# Altium footprint library microbuilder.PCBLIB: 422 footprints (part 25 of 27)
Each footprint in its own frame and in the unit in brackets; x right, y up, seen from the top. Pads: shape width x height; smd on the part's side, far side on the other; paste and mask are expansions set on the pad; w line width, h text height; cw(c..) or ccw(c..) is an arc to the next point about the centre after c.
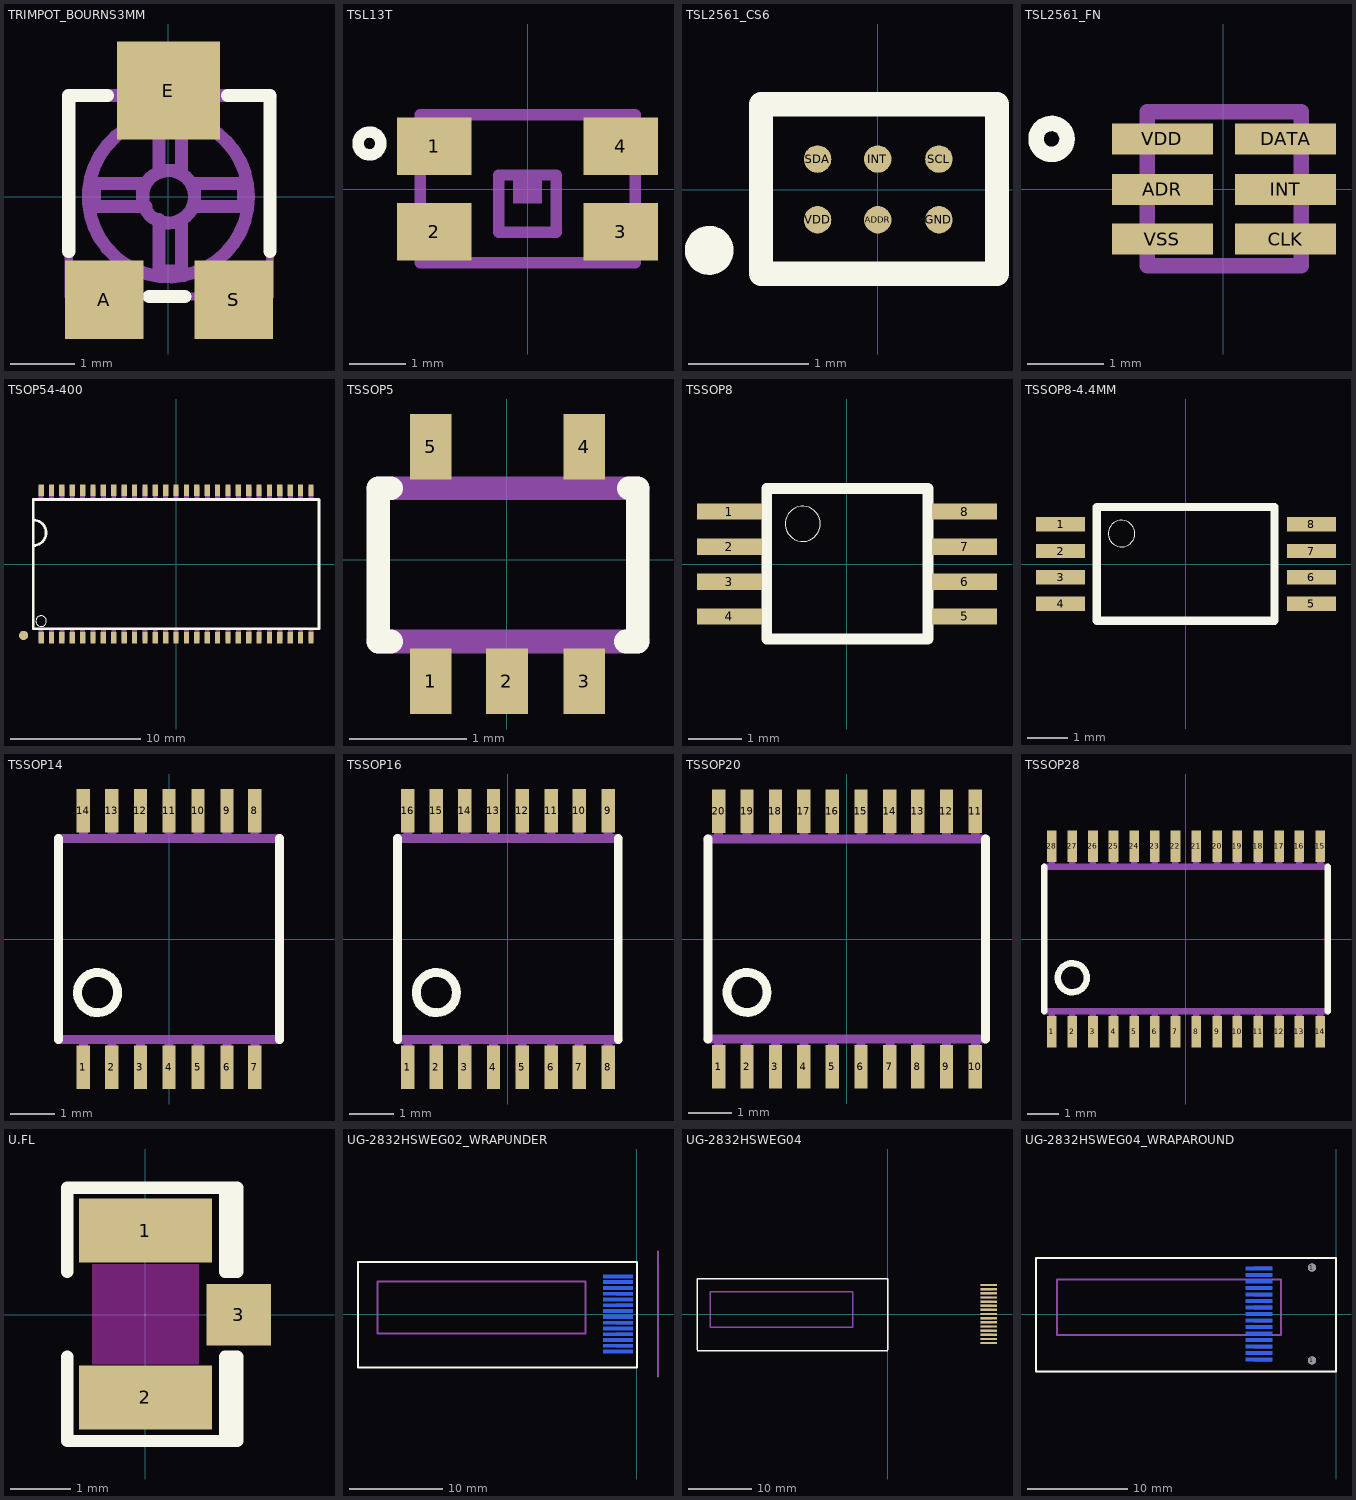
[diagram p24: the footprints below, top view; thin cyan lines are the x and y axes]

## TRIMPOT_BOURNS3MM [mil]
pads (3):
  rect 48x48 smd: A(-39.37,-62.99) S(40,-62.99)
  rect 63x60 smd: E(0,65)
Top Overlay:
  lines w8: -61.02,-33.46 -61.02,62 -37.4,62 ; -11.81,-61.02 10,-61.02 ; 36,62 62,62 62,-33.46
Mechanical 16:
  circle w8: c0,0 r49
  circle w8: c0,0 r16
  lines w5: -61.02,62 -61.02,-61.02 62,-61.02 62,62
  lines w8: -61.02,62 62,62 ; -15.75,-3.94 -15.75,8 -45.28,8 -45.28,-5.91 -13.78,-5.91 ; -5.91,-13.78 -5.91,-45.28 8,-45.28 8,-13.78 ; -5.91,16 -5.91,46 8,46 8,16 -5.91,16 ; 16,-5.91 46,-5.91 46,8 16,8 16,-5.91

## TSL13T [mil]
pads (4):
  rect 52x40 smd: 1(-64.96,30) 2(-64.96,-29.53) 3(65,-29.53) 4(65,30)
Top Overlay:
  circle w8: c-110.24,32 r8
Mechanical 16:
  rectangle: -10,-10 10,10
  lines w8: -74.8,-51.18 75,-51.18 75,52 -74.8,52 -74.8,-51.18 ; -20,-30 20,-30 20,10 -20,10 -20,-30

## TSL2561_CS6 [mil]
pads (6):
  rrect100% 9x9 smd: ADDR(0,-9.84) GND(20,-9.84) INT(0,10) SCL(20,10) SDA(-19.68,10) VDD(-19.68,-9.84)
Top Overlay:
  circle w8: c-55.12,-19.84 r4
  lines w8: -38.19,-27.56 -38.19,28 39,28 39,-27.56 -38.19,-27.56
Mechanical 16:
  lines w5: -38.19,-27.56 39,-27.56 39,28 -38.19,28 -38.19,-27.56
  text "1" at -16.06,-46.06 h18.6
  text "2" at 5,-46.06 h18.6
  text "3" at 27,-46.06 h18.6
  text "6" at -16.06,37 h18.6
  text "5" at 5,37 h18.6
  text "4" at 27,37 h18.6

## TSL2561_FN [mil]
pads (6):
  rect 52x16 smd: ADR(-31.5,0) CLK(32,-25.59) DATA(32,26) INT(32,0) VDD(-31.5,26) VSS(-31.5,-25.59)
Top Overlay:
  circle w8: c-88.58,26 r8
Top Paste:
  rectangle: -56.3,18 -17.91,34
  rectangle: -56.3,-7.68 -17.91,8
  rectangle: -56.3,-33.27 -17.91,-17.91
  rectangle: 18,18 57,34
  rectangle: 18,-7.68 57,8
  rectangle: 18,-33.27 57,-17.91
Mechanical 16:
  lines w8: -39.37,-39.37 40,-39.37 40,40 -39.37,40 -39.37,-39.37

## TSOP54-400 [mil]
pads (55):
  rect 16x36 smd: 1(-409.45,-223.62) 2(-377.95,-223.62) 3(-346.46,-223.62) 4(-314.96,-223.62) 5(-283.46,-223.62) 6(-251.97,-223.62) 7(-220.47,-223.62) 8(-188.98,-223.62) 9(-157.48,-223.62) 10(-125.98,-223.62) 11(-94.49,-223.62) 12(-62.99,-223.62) 13(-31.5,-223.62) 14(0,-223.62) 15(32,-223.62) 16(63,-223.62) 17(95,-223.62) 18(126,-223.62) 19(158,-223.62) 20(189,-223.62) 21(221,-223.62) 22(252,-223.62) 23(284,-223.62) 24(315,-223.62) 25(347,-223.62) 26(378,-223.62) 27(410,-223.62) 28(410,224) 29(378,224) 30(347,224) 31(315,224) 32(284,224) 33(252,224) 34(221,224) 35(189,224) 36(158,224) 37(126,224) 38(95,224) 39(63,224) 40(32,224) 41(0,224) 42(-31.5,224) 43(-62.99,224) 44(-94.49,224) 45(-125.98,224) 46(-157.48,224) 47(-188.98,224) 48(-220.47,224) 49(-251.97,224) 50(-283.46,224) 51(-314.96,224) 52(-346.46,224) 53(-377.95,224) 54(-409.45,224)
  rrect100% 28x28 smd: P$1(-462.6,-216.54)
Top Overlay:
  circle w0: c-409.45,-173.23 r16
  lines w8: -433.4,56 ccw(c-433.4,95) -433.4,134 ; -433.4,56 -433.4,134 ; -433.4,56 -433.4,-196 434,-196 434,196 -433.4,196 -433.4,134
Mechanical 16:
  region: -402.07,-231.5 -402.07,-200 -416.83,-200 -416.83,-231.5
  region: -370.57,-231.5 -370.57,-200 -385.33,-200 -385.33,-231.5
  region: -339.07,-231.5 -339.07,-200 -353.84,-200 -353.84,-231.5
  region: -307.58,-231.5 -307.58,-200 -322.34,-200 -322.34,-231.5
  region: -276.08,-231.5 -276.08,-200 -290.85,-200 -290.85,-231.5
  region: -244.59,-231.5 -244.59,-200 -259.35,-200 -259.35,-231.5
  region: -213.09,-231.5 -213.09,-200 -227.85,-200 -227.85,-231.5
  region: -181.59,-231.5 -181.59,-200 -196.36,-200 -196.36,-231.5
  region: -150.1,-231.5 -150.1,-200 -164.86,-200 -164.86,-231.5
  region: -118.6,-231.5 -118.6,-200 -133.37,-200 -133.37,-231.5
  region: -87.11,-231.5 -87.11,-200 -101.87,-200 -101.87,-231.5
  region: -55.61,-231.5 -55.61,-200 -70.37,-200 -70.37,-231.5
  region: -24.11,-231.5 -24.11,-200 -38.88,-200 -38.88,-231.5
  region: 7.51,-231.62 7.51,-199.87 -7.26,-199.87 -7.26,-231.62
  region: 39.38,-231.75 39.38,-199.75 24.62,-199.75 24.62,-231.75
  region: 70.88,-231.25 70.88,-200.25 56.12,-200.25 56.12,-231.25
  region: 102.38,-231.75 102.38,-199.75 87.62,-199.75 87.62,-231.75
  region: 133.88,-231.25 133.88,-200.25 119.12,-200.25 119.12,-231.25
  region: 165.38,-231.75 165.38,-199.75 150.62,-199.75 150.62,-231.75
  region: 196.88,-231.25 196.88,-200.25 182.12,-200.25 182.12,-231.25
  region: 228.38,-231.75 228.38,-199.75 213.62,-199.75 213.62,-231.75
  region: 259.88,-231.25 259.88,-200.25 245.12,-200.25 245.12,-231.25
  region: 291.38,-231.75 291.38,-199.75 276.62,-199.75 276.62,-231.75
  region: 322.88,-231.25 322.88,-200.25 308.12,-200.25 308.12,-231.25
  region: 354.38,-231.75 354.38,-199.75 339.62,-199.75 339.62,-231.75
  region: 385.88,-231.25 385.88,-200.25 371.12,-200.25 371.12,-231.25
  region: 417.38,-231.75 417.38,-199.75 402.62,-199.75 402.62,-231.75
  region: 402.5,232.5 402.5,200.5 417.5,200.5 417.5,232.5
  region: 386,201 386,232 371,232 371,201
  region: 354.5,200.5 354.5,232.5 339.5,232.5 339.5,200.5
  region: 323,201 323,232 308,232 308,201
  region: 291.5,200.5 291.5,232.5 276.5,232.5 276.5,200.5
  region: 260,201 260,232 245,232 245,201
  region: 228.5,200.5 228.5,232.5 213.5,232.5 213.5,200.5
  region: 197,201 197,232 182,232 182,201
  region: 165.5,200.5 165.5,232.5 150.5,232.5 150.5,200.5
  region: 134,201 134,232 119,232 119,201
  region: 102.5,200.5 102.5,232.5 87.5,232.5 87.5,200.5
  region: 71,201 71,232 56,232 56,201
  region: 39.5,200.5 39.5,232.5 24.5,232.5 24.5,200.5
  region: 7.63,200.63 7.63,232.37 -7.37,232.37 -7.37,200.63
  region: -24,200.75 -24,232.25 -39,232.25 -39,200.75
  region: -55.49,200.75 -55.49,232.25 -70.49,232.25 -70.49,200.75
  region: -86.99,200.75 -86.99,232.25 -101.99,232.25 -101.99,200.75
  region: -118.48,200.75 -118.48,232.25 -133.48,232.25 -133.48,200.75
  region: -149.98,200.75 -149.98,232.25 -164.98,232.25 -164.98,200.75
  region: -181.48,200.75 -181.48,232.25 -196.48,232.25 -196.48,200.75
  region: -212.97,200.75 -212.97,232.25 -227.97,232.25 -227.97,200.75
  region: -244.47,200.75 -244.47,232.25 -259.47,232.25 -259.47,200.75
  region: -275.96,200.75 -275.96,232.25 -290.96,232.25 -290.96,200.75
  region: -307.46,200.75 -307.46,232.25 -322.46,232.25 -322.46,200.75
  region: -338.96,200.75 -338.96,232.25 -353.96,232.25 -353.96,200.75
  region: -370.45,200.75 -370.45,232.25 -385.45,232.25 -385.45,200.75
  region: -401.95,200.75 -401.95,232.25 -416.95,232.25 -416.95,200.75

## TSSOP5 [mil]
pads (5):
  rect 14x22 smd: 1(-25.59,-40.94) 2(0,-40.94) 3(26,-40.94) 4(26,38) 5(-25.59,38)
Top Overlay:
  lines w8: -38.98,-27.56 -43.31,-27.56 -43.31,24 -38.98,24 ; 40,-27.56 44,-27.56 44,24 41,24
Mechanical 16:
  lines w5: -43.31,-27.56 -43.31,24 ; 44,-27.56 44,24
  lines w8: -43.31,-27.56 44,-27.56 ; -43.31,24 44,24

## TSSOP8 [mil]
pads (8):
  rect 48x12 smd: 1(-86.61,39) 2(-86.61,13) 3(-86.61,-12.8) 4(-86.61,-38.39) 5(87,-38.39) 6(87,-12.8) 7(87,13) 8(87,39)
Top Overlay:
  circle w0: c-32.48,30 r13
  lines w8: -59.06,-55.12 60,-55.12 60,56 -59.06,56 -59.06,-55.12
Top Paste:
  rectangle: -109,34 -65,43
  rectangle: -109,8 -65,17
  rectangle: -109,-17 -65,-8
  rectangle: -109,-43 -65,-34
  rectangle: 65,-43 109,-34
  rectangle: 65,-17 109,-8
  rectangle: 65,8 109,17
  rectangle: 65,34 109,43
Mechanical 16:
  rectangle: -102.36,34 -62.99,44
  rectangle: -102.36,8 -62.99,18
  rectangle: -102.36,-17.72 -62.99,-7.87
  rectangle: -102.36,-43.31 -62.99,-33.46
  rectangle: 63,-43.31 103,-33.46
  rectangle: 63,-17.72 103,-7.87
  rectangle: 63,8 103,18
  rectangle: 63,34 103,44

## TSSOP8-4.4MM [mil]
pads (8):
  rect 48x14 smd: 1(-122.05,39) 2(-122.05,13) 3(-122.05,-12.8) 4(-122.05,-38.39) 5(123,-38.39) 6(123,-12.8) 7(123,13) 8(123,39)
Top Overlay:
  circle w0: c-62.48,30 r13
  lines w8: -86.61,-55.12 87,-55.12 87,56 -86.61,56 -86.61,-55.12
Mechanical 16:
  rectangle: -137.8,34 -98.43,44
  rectangle: -137.8,8 -98.43,18
  rectangle: -137.8,-17.72 -98.43,-7.87
  rectangle: -137.8,-43.31 -98.43,-33.46
  rectangle: 99,-43.31 138,-33.46
  rectangle: 99,-17.72 138,-7.87
  rectangle: 99,8 138,18
  rectangle: 99,34 138,44

## TSSOP14 [mil]
pads (14):
  rect 12x39 smd: 1(-76.77,-114.87) 2(-51.18,-114.87) 3(-25.59,-114.87) 4(0,-114.87) 5(26,-114.87) 6(52,-114.87) 7(77,-114.87) 8(77,115) 9(52,115) 10(26,115) 11(0,115) 12(-25.59,115) 13(-51.18,115) 14(-76.77,115)
Top Overlay:
  circle w8: c-64,-48 r18
  lines w8: -99,-89.87 -99,90 ; 99,-89.87 99,90
Mechanical 16:
  rectangle: -80.77,-122.87 -72.77,-89.87
  rectangle: -55.18,-122.87 -47.18,-89.87
  rectangle: -29.59,-122.87 -21.59,-89.87
  rectangle: -4,-122.87 4,-89.87
  rectangle: 22,-122.87 30,-89.87
  rectangle: 48,-122.87 56,-89.87
  rectangle: 73,-122.87 81,-89.87
  rectangle: 73,90 81,123
  rectangle: 48,90 56,123
  rectangle: 22,90 30,123
  rectangle: -4,90 4,123
  rectangle: -29.59,90 -21.59,123
  rectangle: -55.18,90 -47.18,123
  rectangle: -80.77,90 -72.77,123
  lines w8: -99,-89.87 99,-89.87 ; -99,90 99,90

## TSSOP16 [mil]
pads (16):
  rect 12x39 smd: 1(-89.57,-114.87) 2(-63.98,-114.87) 3(-38.39,-114.87) 4(-12.8,-114.87) 5(13,-114.87) 6(39,-114.87) 7(64,-114.87) 8(90,-114.87) 9(90,115) 10(64,115) 11(39,115) 12(13,115) 13(-12.8,115) 14(-38.39,115) 15(-63.98,115) 16(-89.57,115)
Top Overlay:
  circle w8: c-64,-48 r18
  lines w8: -99,-89.87 -99,90 ; 99,-89.87 99,90
Mechanical 16:
  rectangle: -93.57,-122.87 -85.57,-89.87
  rectangle: -67.98,-122.87 -59.98,-89.87
  rectangle: -42.39,-122.87 -34.39,-89.87
  rectangle: -16.8,-122.87 -8.8,-89.87
  rectangle: 9,-122.87 17,-89.87
  rectangle: 35,-122.87 43,-89.87
  rectangle: 60,-122.87 68,-89.87
  rectangle: 86,-122.87 94,-89.87
  rectangle: 86,90 94,123
  rectangle: 60,90 68,123
  rectangle: 35,90 43,123
  rectangle: 9,90 17,123
  rectangle: -16.8,90 -8.8,123
  rectangle: -42.39,90 -34.39,123
  rectangle: -67.98,90 -59.98,123
  rectangle: -93.57,90 -85.57,123
  lines w8: -99,-89.87 99,-89.87 ; -99,90 99,90

## TSSOP20 [mil]
pads (20):
  rect 12x39 smd: 1(-115.16,-114.87) 2(-89.57,-114.87) 3(-63.98,-114.87) 4(-38.39,-114.87) 5(-12.8,-114.87) 6(13,-114.87) 7(39,-114.87) 8(64,-114.87) 9(90,-114.87) 10(116,-114.87) 11(116,115) 12(90,115) 13(64,115) 14(39,115) 15(13,115) 16(-12.8,115) 17(-38.39,115) 18(-63.98,115) 19(-89.57,115) 20(-115.16,115)
Top Overlay:
  circle w8: c-89.59,-48 r18
  lines w8: -124.59,-89.87 -124.59,90 ; 125,-89.87 125,90
Mechanical 16:
  rectangle: -119.16,-122.87 -111.16,-89.87
  rectangle: -93.57,-122.87 -85.57,-89.87
  rectangle: -67.98,-122.87 -59.98,-89.87
  rectangle: -42.39,-122.87 -34.39,-89.87
  rectangle: -16.8,-122.87 -8.8,-89.87
  rectangle: 9,-122.87 17,-89.87
  rectangle: 35,-122.87 43,-89.87
  rectangle: 60,-122.87 68,-89.87
  rectangle: 60,90 68,123
  rectangle: 35,90 43,123
  rectangle: 9,90 17,123
  rectangle: -16.8,90 -8.8,123
  rectangle: -42.39,90 -34.39,123
  rectangle: -67.98,90 -59.98,123
  rectangle: -93.57,90 -85.57,123
  rectangle: -119.16,90 -111.16,123
  rectangle: 86,-122.87 94,-89.87
  rectangle: 112,-122.87 120,-89.87
  rectangle: 86,90 94,123
  rectangle: 112,90 120,123
  lines w8: -124.59,-89.87 125,-89.87 ; -124.59,90 125,90

## TSSOP28 [mil]
pads (28):
  rect 12x39 smd: 1(-166.34,-114.87) 2(-140.75,-114.87) 3(-115.16,-114.87) 4(-89.57,-114.87) 5(-63.98,-114.87) 6(-38.39,-114.87) 7(-12.8,-114.87) 8(13,-114.87) 9(39,-114.87) 10(64,-114.87) 11(90,-114.87) 12(116,-114.87) 13(141,-114.87) 14(167,-114.87) 15(167,115) 16(141,115) 17(116,115) 18(90,115) 19(64,115) 20(39,115) 21(13,115) 22(-12.8,115) 23(-38.39,115) 24(-63.98,115) 25(-89.57,115) 26(-115.16,115) 27(-140.75,115) 28(-166.34,115)
Top Overlay:
  circle w8: c-140.77,-48 r18
  lines w8: -175.77,-89.87 -175.77,90 ; 176,-89.87 176,90
Mechanical 16:
  rectangle: -170.34,-122.87 -162.34,-89.87
  rectangle: -144.75,-122.87 -136.75,-89.87
  rectangle: -119.16,-122.87 -111.16,-89.87
  rectangle: -93.57,-122.87 -85.57,-89.87
  rectangle: -67.98,-122.87 -59.98,-89.87
  rectangle: -42.39,-122.87 -34.39,-89.87
  rectangle: -16.8,-122.87 -8.8,-89.87
  rectangle: 9,-122.87 17,-89.87
  rectangle: 9,90 17,123
  rectangle: -16.8,90 -8.8,123
  rectangle: -42.39,90 -34.39,123
  rectangle: -67.98,90 -59.98,123
  rectangle: -93.57,90 -85.57,123
  rectangle: -119.16,90 -111.16,123
  rectangle: -144.75,90 -136.75,123
  rectangle: -170.34,90 -162.34,123
  rectangle: 35,-122.87 43,-89.87
  rectangle: 60,-122.87 68,-89.87
  rectangle: 35,90 43,123
  rectangle: 60,90 68,123
  rectangle: 86,-122.87 94,-89.87
  rectangle: 112,-122.87 120,-89.87
  rectangle: 137,-122.87 145,-89.87
  rectangle: 163,-122.87 171,-89.87
  rectangle: 163,90 171,123
  rectangle: 137,90 145,123
  rectangle: 112,90 120,123
  rectangle: 86,90 94,123
  lines w8: -175.77,-89.87 176,-89.87 ; -175.77,90 176,90

## U.FL [mil]
pads (3):
  rect 87x42 smd: 1(0,55) 2(0,-54.13)
  rect 42x40 smd: 3(61,0)
Top Layer keep-out:
  rectangle: -35,-32.5 35,33
Top Overlay:
  lines w8: -51.18,-27.56 -51.18,-82.68 52,-82.68 ; -51.18,28 -51.18,83 52,83 ; 56,-78.74 56,-27.56 ; 56,28 56,79 ; 52,-82.68 52,-27.56 60,-27.56 60,-82.68 52,-82.68 ; 52,83 52,28 60,28 60,83 52,83

## UG-2832HSWEG02_WRAPUNDER [mil]
pads (14):
  rect 126x14 smd far side: 1(-79.92,-158.66) 2(-79.92,-134.25) 3(-79.92,-109.84) 4(-79.92,-85.43) 5(-79.92,-61.02) 6(-79.92,-36.61) 7(-79.92,-12.2) 8(-79.92,13) 9(-79.92,37) 10(-79.92,62) 11(-79.92,86) 12(-79.92,110) 13(-79.92,135) 14(-79.92,159)
Top Overlay:
  lines w8: -1181.1,-226.38 0,-226.38 0,220 -1181.1,220 -1181.1,-226.38
Mechanical 16:
  lines w5: -1181.1,-226.38 0,-226.38 ; -1181.1,-219.49 -1181.1,220 0,220 0,-219.49
  lines w8: 89,-265.75 89,266 ; -1098.43,-83.03 -217.17,-83.03 -217.17,137 -1098.43,137 -1098.43,-83.03
  text "Active Area 0.91\"" at -905.51,40 h62
  text "128x32 Pixels" at -866.14,-39.37 h62
  text "PCB Edge" at 77,-88.58 h37.2
Mechanical 30:
  rectangle: -87.8,-165.55 -16.93,-151.77
  rectangle: -87.8,-141.14 -16.93,-127.36
  rectangle: -87.8,-116.73 -16.93,-102.95
  rectangle: -87.8,-92.32 -16.93,-78.54
  rectangle: -87.8,-67.91 -16.93,-54.13
  rectangle: -87.8,-43.5 -16.93,-29.72
  rectangle: -87.8,-19.09 -16.93,-5.32
  rectangle: -87.8,6 -16.93,20
  rectangle: -87.8,30 -16.93,44
  rectangle: -87.8,55 -16.93,68
  rectangle: -87.8,79 -16.93,93
  rectangle: -87.8,103 -16.93,117
  rectangle: -87.8,128 -16.93,142
  rectangle: -87.8,152 -16.93,166

## UG-2832HSWEG04 [mil]
pads (15):
  rect 103x14 smd: 1(623,-179.13) 2(623,-153.54) 3(623,-127.95) 4(623,-102.36) 5(623,-76.77) 6(623,-51.18) 7(623,-25.59) 8(623,0) 9(623,26) 10(623,52) 11(623,77) 12(623,103) 13(623,128) 14(623,154) 15(623,180)
Top Overlay:
  lines w8: -1181.1,-226.38 0,-226.38 ; -1181.1,-219.49 -1181.1,220 0,220 0,-219.49
Mechanical 16:
  rectangle: 571,-6.89 642,7
  rectangle: 571,173 642,187
  rectangle: 571,147 642,161
  rectangle: 571,122 642,135
  rectangle: 571,96 642,110
  rectangle: 571,70 642,84
  rectangle: 571,45 642,59
  rectangle: 571,19 642,33
  rectangle: 571,-32.48 642,-18.7
  rectangle: 571,-58.07 642,-44.29
  rectangle: 571,-83.66 642,-69.88
  rectangle: 571,-109.25 642,-95.47
  rectangle: 571,-134.84 642,-121.06
  rectangle: 571,-160.43 642,-146.65
  rectangle: 571,-186.02 642,-172.24
  lines w5: -1181.1,-226.38 0,-226.38 ; -1181.1,-219.49 -1181.1,220 0,220 0,-219.49
  lines w8: -1098.43,-83.03 -217.17,-83.03 -217.17,137 -1098.43,137 -1098.43,-83.03
  text "Active Area 0.91\"" at -905.51,40 h62
  text "128x32 Pixels" at -866.14,-39.37 h62

## UG-2832HSWEG04_WRAPAROUND [mil]
pads (17):
  rect 103x14 smd far side: 1(-303.15,-179.13) 2(-303.15,-153.54) 3(-303.15,-127.95) 4(-303.15,-102.36) 5(-303.15,-76.77) 6(-303.15,-51.18) 7(-303.15,-25.59) 8(-303.15,0) 9(-303.15,26) 10(-303.15,52) 11(-303.15,77) 12(-303.15,103) 13(-303.15,128) 14(-303.15,154) 15(-303.15,180)
  round 32 hole 32: 1(-94.49,-182.09) 1(-94.49,183)
Top Overlay:
  lines w8: -1181.1,-226.38 0,-226.38 0,220 -1181.1,220 -1181.1,-226.38
Mechanical 16:
  rectangle: -322.83,173 -251.97,187
  rectangle: -322.83,147 -251.97,161
  rectangle: -322.83,122 -251.97,135
  rectangle: -322.83,96 -251.97,110
  rectangle: -322.83,70 -251.97,84
  rectangle: -322.83,45 -251.97,59
  rectangle: -322.83,19 -251.97,33
  rectangle: -322.83,-6.89 -251.97,7
  rectangle: -322.83,-32.48 -251.97,-18.7
  rectangle: -322.83,-58.07 -251.97,-44.29
  rectangle: -322.83,-83.66 -251.97,-69.88
  rectangle: -322.83,-109.25 -251.97,-95.47
  rectangle: -322.83,-134.84 -251.97,-121.06
  rectangle: -322.83,-160.43 -251.97,-146.65
  rectangle: -322.83,-186.02 -251.97,-172.24
  lines w5: -1181.1,-226.38 0,-226.38 ; -1181.1,-219.49 -1181.1,220 0,220 0,-219.49
  lines w8: -1098.43,-83.03 -217.17,-83.03 -217.17,137 -1098.43,137 -1098.43,-83.03
  text "Active Area 0.91\"" at -905.51,40 h62
  text "128x32 Pixels" at -866.14,-39.37 h62